# Altium footprint library PcbLib1.PcbLib: 170 footprints (part 1 of 11)
Each footprint in its own frame and in the unit in brackets; x right, y up, seen from the top. Pads: shape width x height; smd on the part's side, far side on the other; paste and mask are expansions set on the pad; w line width, h text height; cw(c..) or ccw(c..) is an arc to the next point about the centre after c.
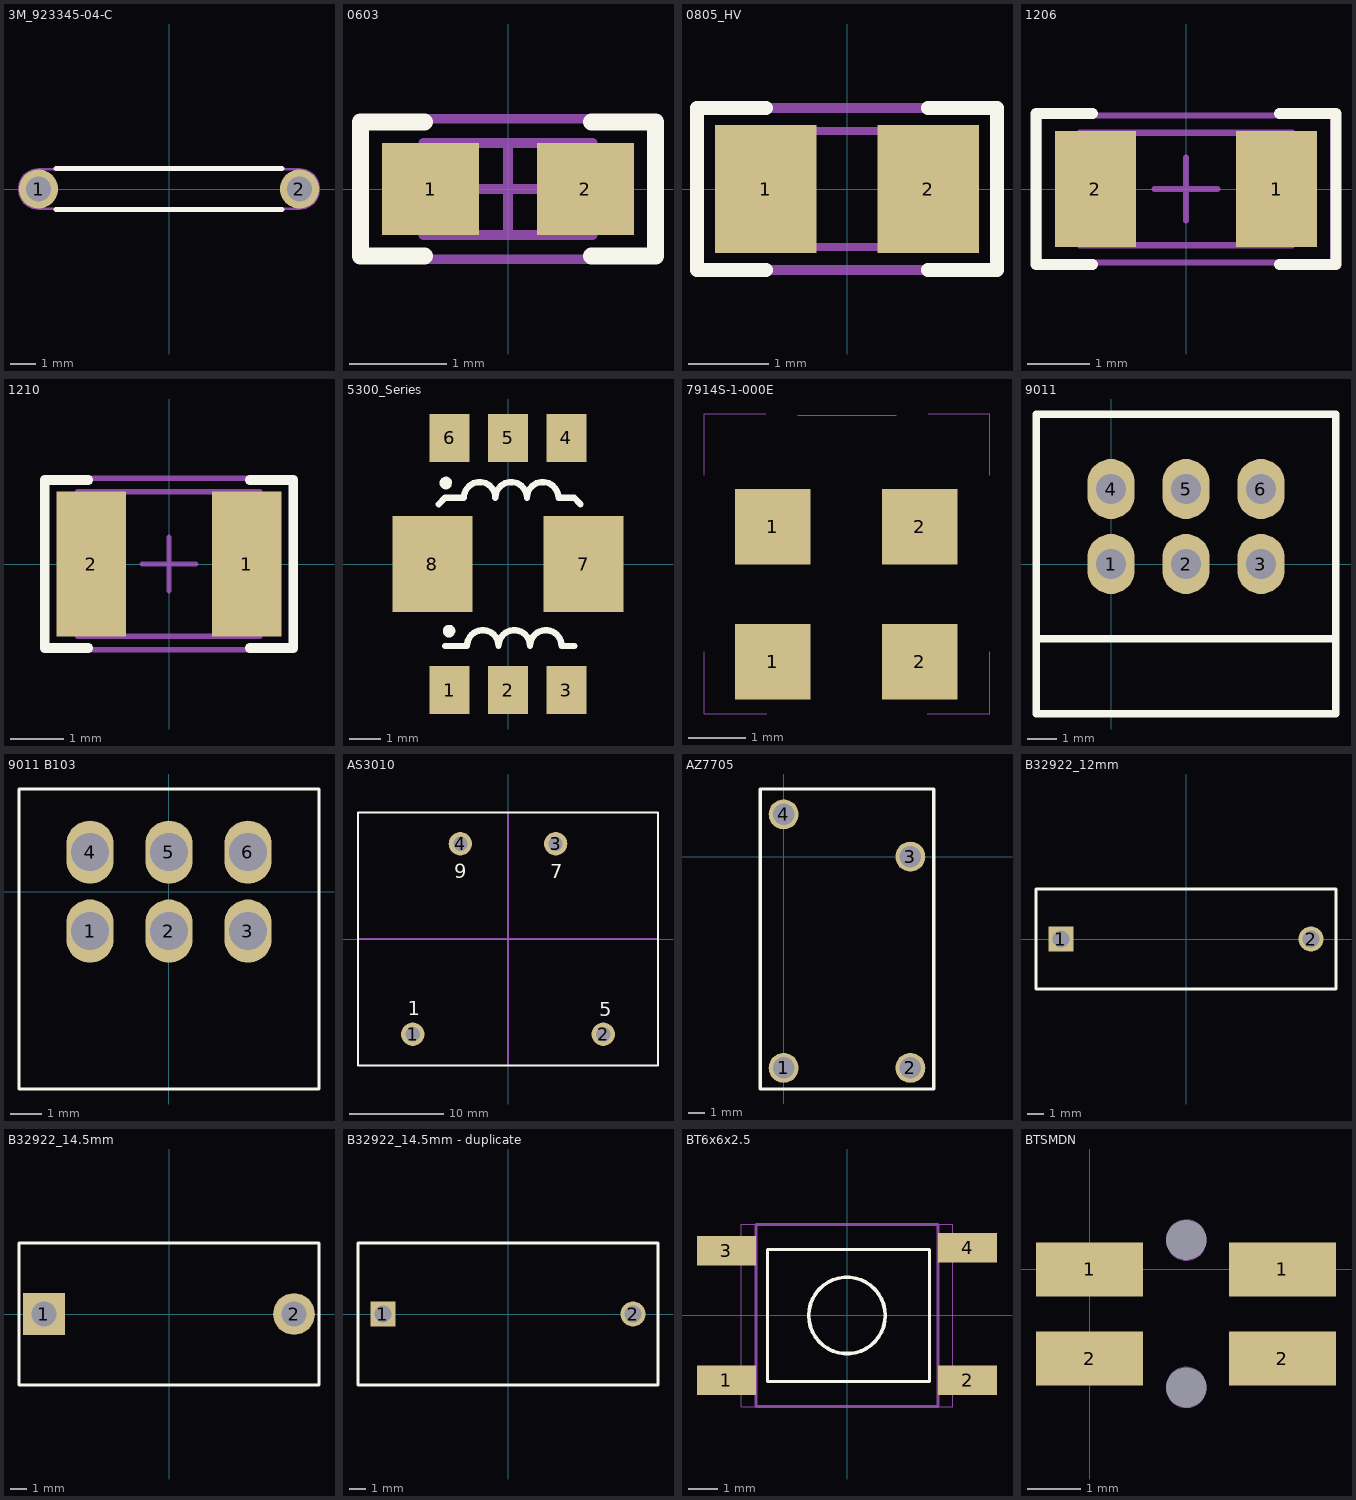
[diagram p0: the footprints below, top view; thin cyan lines are the x and y axes]

## 3M_923345-04-C [mil] "Jumper Wire, 400 mil Spacing, Yellow, Pkg of 200"
height 80
pads (2):
  round 60 hole 38: 1(-200,0) 2(200,0)
Top Overlay:
  lines w7.87: -173.23,-31.5 173.23,-31.5 ; -173.23,31.5 173.23,31.5
Mechanical 5:
  lines w3.94: -200,-30 cw(c-200,0) -200,30 200,30 cw(c200,0) 200,-30 -200,-30
3D body: height 65, standoff 35, extent -214.85,-14.89 -185.01,14.98
3D body: height 65, standoff 35, extent 185.16,-14.93 215,14.94
3D body: height 50, standoff -98.43, extent 185,-14.97 214.88,14.97
3D body: height 50, standoff -98.43, extent -214.88,-14.96 -185,14.98
3D body: height 64.88, standoff 35, extent -200,-14.97 200,14.97
3D body: height 79.76, standoff 20, extent -180,-29.94 180,29.94

## 0603 [mm] "0603 from SM-752 data"
height 1
pads (2):
  rect 1x0.95 smd: 1(-0.8,0) 2(0.8,0)
Top Overlay:
  lines w0.178: -0.864,-0.691 -1.524,-0.691 -1.524,0.693 -0.864,0.693 ; 0.864,-0.691 1.524,-0.691 1.524,0.693 0.864,0.693
Mechanical 5:
  lines w0.1: -1.55,-0.725 1.55,-0.725 1.55,0.725 -1.55,0.725 -1.55,-0.725
Mechanical 13:
  lines w0.1: -0.55,-0.475 -0.55,0.475 ; 0.55,-0.475 0.55,0.475 ; -0.875,-0.475 -0.875,0.475 0.875,0.475 0.875,-0.475 -0.875,-0.475
Mechanical 15:
  lines w0.1: -0.475,0 0.475,0 ; 0,-0.475 0,0.475 ; -1.55,-0.725 -1.55,0.725 1.55,0.725 1.55,-0.725 -1.55,-0.725
3D body: height 1, standoff 0, extent 0.551,-0.474 0.874,0.474
3D body: height 1, standoff 0, extent -0.549,-0.474 0.549,0.474
3D body: height 1, standoff 0, extent -0.874,-0.474 -0.551,0.474

## 0805_HV [mil] "0805 with 30mil clearance between pads"
height 57.09
pads (2):
  rect 50x63 smd: 1(-40,0) 2(40,0)
Top Overlay:
  lines w7: -40,-40 -74,-40 -74,0 -74,40 -40,40 ; 40,-40 74,-40 74,0 74,40 40,40
Mechanical 5:
  lines w5: -74,-40 74,-40 74,40 -74,40 -74,-40
Mechanical 13:
  lines w3.94: -25.59,-28.54 -25.59,28.54 ; 25.59,-28.54 25.59,28.54 ; -43.31,-28.54 43.31,-28.54 43.31,28.54 -43.31,28.54 -43.31,-28.54
3D body: height 57.09, standoff 0, extent -43.29,-28.52 -25.61,28.52
3D body: height 57.09, standoff 0, extent -25.57,-28.52 25.57,28.52
3D body: height 57.09, standoff 0, extent 25.61,-28.52 43.29,28.52

## 1206 [mm] "1206 from SM-752 data"
height 1.35
pads (2):
  rect 1.3x1.85 smd: 1(1.45,0) 2(-1.45,0)
Top Overlay:
  lines w0.178: -1.5,-1.21 -2.4,-1.21 -2.4,1.21 -1.5,1.21 ; 1.5,-1.21 2.4,-1.21 2.4,1.21 1.5,1.21
Mechanical 5:
  lines w0.1: -1.7,-0.9 1.7,-0.9 1.7,0.9 -1.7,0.9 -1.7,-0.9
Mechanical 13:
  lines w0.1: -1.2,-0.9 -1.2,0.9 ; 1.2,-0.9 1.2,0.9 ; -1.7,-0.9 1.7,-0.9 1.7,0.9 -1.7,0.9 -1.7,-0.9
Mechanical 15:
  lines w0.1: -0.5,0 0.5,0 ; 0,-0.5 0,0.5 ; -2.35,-1.175 2.35,-1.175 2.35,1.175 -2.35,1.175 -2.35,-1.175
3D body: height 1.35, standoff 0, extent 1.201,-0.899 1.699,0.899
3D body: height 1.35, standoff 0, extent -1.199,-0.899 1.199,0.899
3D body: height 1.35, standoff 0, extent -1.699,-0.899 -1.201,0.899

## 1210 [mm] "1210 from SM-752 data"
height 1.35
pads (2):
  rect 1.3x2.7 smd: 1(1.45,0) 2(-1.45,0)
Top Overlay:
  lines w0.178: -1.511,-1.568 -2.316,-1.568 -2.316,1.568 -1.511,1.568 ; 1.511,-1.568 2.316,-1.568 2.316,1.568 1.511,1.568
Mechanical 5:
  lines w0.1: -1.7,-1.35 -1.7,1.35 1.7,1.35 1.7,-1.35 -1.7,-1.35
Mechanical 13:
  lines w0.1: -1.2,-1.35 -1.2,1.35 ; 1.2,-1.35 1.2,1.35 ; -1.7,-1.35 1.7,-1.35 1.7,1.35 -1.7,1.35 -1.7,-1.35
Mechanical 15:
  lines w0.1: -0.5,0 0.5,0 ; 0,-0.5 0,0.5 ; -2.35,-1.6 -2.35,1.6 2.35,1.6 2.35,-1.6 -2.35,-1.6
3D body: height 1.35, standoff 0, extent 1.201,-1.349 1.699,1.349
3D body: height 1.35, standoff 0, extent -1.199,-1.349 1.199,1.349
3D body: height 1.35, standoff 0, extent -1.699,-1.349 -1.201,1.349

## 5300_Series [mm] "Current Sensing Transformers"
pads (8):
  rect 1.27x1.52 smd: 1(-1.85,-4) 2(0,-4) 3(1.85,-4) 4(1.85,4) 5(0,4) 6(-1.85,4)
  rect 2.54x3.05 smd: 7(2.4,0) 8(-2.4,0)
Top Overlay:
  lines w0.2: -2.2,1.9 -2,2.1 -1.4,2.1 cw(c-0.9,2.1) -0.4,2.1 cw(c0.1,2.1) 0.6,2.1 cw(c1.1,2.1) 1.6,2.1 2.1,2.1 2.3,1.9 ; -2,-2.6 -1.3,-2.6 cw(c-0.8,-2.6) -0.3,-2.6 cw(c0.2,-2.6) 0.7,-2.6 cw(c1.2,-2.6) 1.7,-2.6 2.1,-2.6 ; -1.9,2.5 cw(c-1.971,2.571) -1.871,2.571 ; -1.8,-2.2 cw(c-1.871,-2.129) -1.771,-2.129

## 7914S-1-000E [mm] "SWITCH TACTILE SPST-NO 0.1A 16V"
pads (4):
  rect 1.3x1.3 smd paste+0: 1(-1249.62,-1257.78) 1(-1249.62,-1255.45) 2(-1247.08,-1257.78) 2(-1247.08,-1255.45)
Mechanical 13:
  lines w0.013: -1250.8,-1257.608 -1250.8,-1258.683 -1249.725,-1258.683 ; -1250.8,-1254.56 -1250.8,-1253.501 -1249.741,-1253.501 ; -1249.62,-1258.163 -1249.62,-1257.387 ; -1249.62,-1255.895 -1249.62,-1255 ; -1247.486,-1253.522 -1249.187,-1253.522 -1249.187,-1253.521 ; -1247.08,-1255.895 -1247.08,-1255 ; -1247.078,-1258.163 -1247.078,-1257.387 ; -1246.947,-1258.683 -1245.872,-1258.683 -1245.872,-1257.608 ; -1246.931,-1253.501 -1245.872,-1253.501 -1245.872,-1254.56 ; -1249.187,-1253.521 -1249.187,-1253.521 ; -1250,-1258.163 -1250,-1257.387 -1249.238,-1257.387 -1249.238,-1258.163 -1250,-1258.163 ; -1250,-1255.895 -1250,-1255 -1249.238,-1255 -1249.238,-1255.895 -1250,-1255.895 ; -1247.46,-1258.163 -1247.46,-1257.387 -1246.698,-1257.387 -1246.698,-1258.163 -1247.46,-1258.163 ; -1247.46,-1255.895 -1247.46,-1255 -1246.698,-1255 -1246.698,-1255.895 -1247.46,-1255.895
3D body: height 5.45, standoff 0.01, extent -1250.874,-1258.683 -1245.826,-1251.85

## 9011 [mil]
pads (6):
  oval 62.99x80 hole 40: 1(0,0) 2(100,0) 3(200,0) 4(0,100) 5(100,100) 6(200,100)
Top Overlay:
  lines w10: -100,-90 -100,-100 300,-100 ; -100,-200 -100,200 300,200 300,-200 -100,-200
3D body: height 446.85, standoff -137.8, extent -86,-788.55 288.01,177.99

## 9011 B103 [mm] "9011 B103"
pads (6):
  oval 1.5x2 hole 1.2 paste+0: 1(-2.5,-1.25) 2(0,-1.25) 3(2.5,-1.25) 4(-2.5,1.25) 5(0,1.25) 6(2.5,1.25)
Top Overlay:
  lines w0.1: -4.75,-6.25 -4.75,3.25 4.75,3.25 4.75,-6.25 -4.75,-6.25

## AS3010 [mm] "S3010-E-0150-120-S"
height 3.05
pads (4):
  round 2.5 hole 1.5: 1(-10.16,-10.16) 2(10.16,-10.16) 3(5.08,10.16) 4(-5.08,10.16)
Top Overlay:
  lines w0.2: -16,-13.5 16,-13.5 16,13.5 -16,13.5 -16,-13.5
  text "1" at -10.668,-8.128 h1.5
  text "5" at 9.75,-8.25 h1.5
  text "9" at -5.75,6.5 h1.5
  text "7" at 4.5,6.5 h1.5
Mechanical 13:
  lines w0.2: -16,0 16,0 ; 0,-13.5 0,13.5

## AZ7705 [mm] "AZ7705"
height 1
pads (4):
  round 1.8 hole 1.3: 1(0,-12.7) 2(7.62,-12.7) 3(7.62,0) 4(0,2.54)
Top Overlay:
  lines w0.2: -1.397,-13.97 -1.397,4.064 9.017,4.064 9.017,-13.97 -1.397,-13.97
3D body: height 15, standoff -4, extent -1.29,-13.799 8.91,4.401

## B32922_12mm [mm] "Epcos film capacitors, 15mm spacing"
height 12
pads (2):
  rect 1.5x1.5 hole 0.991: 1(-7.5,0)
  round 1.5 hole 0.991: 2(7.5,0)
Top Overlay:
  lines w0.178: -9,-3 0,-3 9,-3 9,3 0,3 -9,3 -9,0 -9,-3
Mechanical 5:
  lines w0.127: -9,-3 -9,0 -9,3 0,3 9,3 9,-3 0,-3 -9,-3
3D body: height 12, standoff 0, extent -8.999,-2.999 8.999,2.999

## B32922_14.5mm [mm] "Epcos film capacitors, 15mm spacing"
height 14.5
pads (2):
  rect 2.5x2.5 hole 1.5: 1(-7.5,0)
  round 2.5 hole 1.5: 2(7.5,0)
Top Overlay:
  lines w0.178: -9,-4.25 0,-4.25 9,-4.25 9,0 9,4.25 0,4.25 -9,4.25 -9,0 -9,-4.25
Mechanical 5:
  lines w0.127: -9,-4.25 -9,0 -9,4.25 0,4.25 9,4.25 9,0 9,-4.25 0,-4.25 -9,-4.25
3D body: height 14.5, standoff 0, extent -8.999,-4.249 8.999,4.249

## B32922_14.5mm - duplicate [mm] "Epcos film capacitors, 15mm spacing"
height 14.5
pads (2):
  rect 1.5x1.5 hole 1: 1(-7.5,0)
  round 1.5 hole 1: 2(7.5,0)
Top Overlay:
  lines w0.178: -9,-4.25 -9,0 -9,4.25 0,4.25 9,4.25 9,0 9,-4.25 0,-4.25 -9,-4.25
Mechanical 5:
  lines w0.127: -9,-4.25 0,-4.25 9,-4.25 9,0 9,4.25 0,4.25 -9,4.25 -9,0 -9,-4.25
3D body: height 14.5, standoff 0, extent -8.999,-4.249 8.999,4.249

## BT6x6x2.5 [mm] "6x6x2.5"
height 2.5
pads (4):
  rect 2x1 smd: 1(-4.1,-2.2) 2(4.1,-2.2) 3(-4.1,2.2) 4(4.1,2.3)
Top Overlay:
  circle w0.127: c0,0 r1.3
  lines w0.1: -2.7,-2.25 -2.7,2.25 2.8,2.25 2.8,-2.25 -2.7,-2.25
Mechanical 1:
  lines w0.013: -3.6,-3.1 3.6,-3.1 3.6,3.1 -3.6,3.1 -3.6,-3.1
  lines w0.1: -3.1,-3.1 -3.1,3.1 3.1,3.1 3.1,-3.1 -3.1,-3.1

## BTSMDN [mm]
pads (6):
  rect 2x1 smd: 1(0,0) 1(3.6,0) 2(0,-1.662) 2(3.6,-1.662)
  round 0 hole 0.75 paste+0: 5(1.806,0.549) 6(1.806,-2.201)
Mechanical 1:
  circle w0.013: c1.806,-2.201 r0.375
  circle w0.013: c1.806,0.549 r0.375
  lines w0.013: -0.464,-1.976 -0.816,-1.976 ; -0.464,-1.376 -0.816,-1.376 ; -0.464,-0.276 -0.816,-0.276 ; -0.464,0.324 -0.816,0.324 ; 4.076,-1.976 4.429,-1.976 ; 4.076,-1.376 4.429,-1.376 ; 4.076,-0.276 4.429,-0.276 ; 4.076,0.324 4.429,0.324 ; -0.816,-1.976 -0.816,-1.376 ; -0.816,-1.976 -0.946,-1.976 -0.946,-1.376 -0.816,-1.376 ; -0.816,-0.276 -0.816,0.324 ; -0.816,-0.276 -0.946,-0.276 -0.946,0.324 -0.816,0.324 ; 4.429,-1.976 4.429,-1.376 ; 4.429,-1.976 4.559,-1.976 4.559,-1.376 4.429,-1.376 ; 4.429,-0.276 4.429,0.324 ; 4.429,-0.276 4.559,-0.276 4.559,0.324 4.429,0.324
3D body: height 1.66, standoff -0.49, extent -0.962,-2.583 4.544,1.917